# Altium footprint library 20210518.PcbLib: 414 footprints (part 5 of 26)
Each footprint in its own frame and in the unit in brackets; x right, y up, seen from the top. Pads: shape width x height; smd on the part's side, far side on the other; paste and mask are expansions set on the pad; w line width, h text height; cw(c..) or ccw(c..) is an arc to the next point about the centre after c.
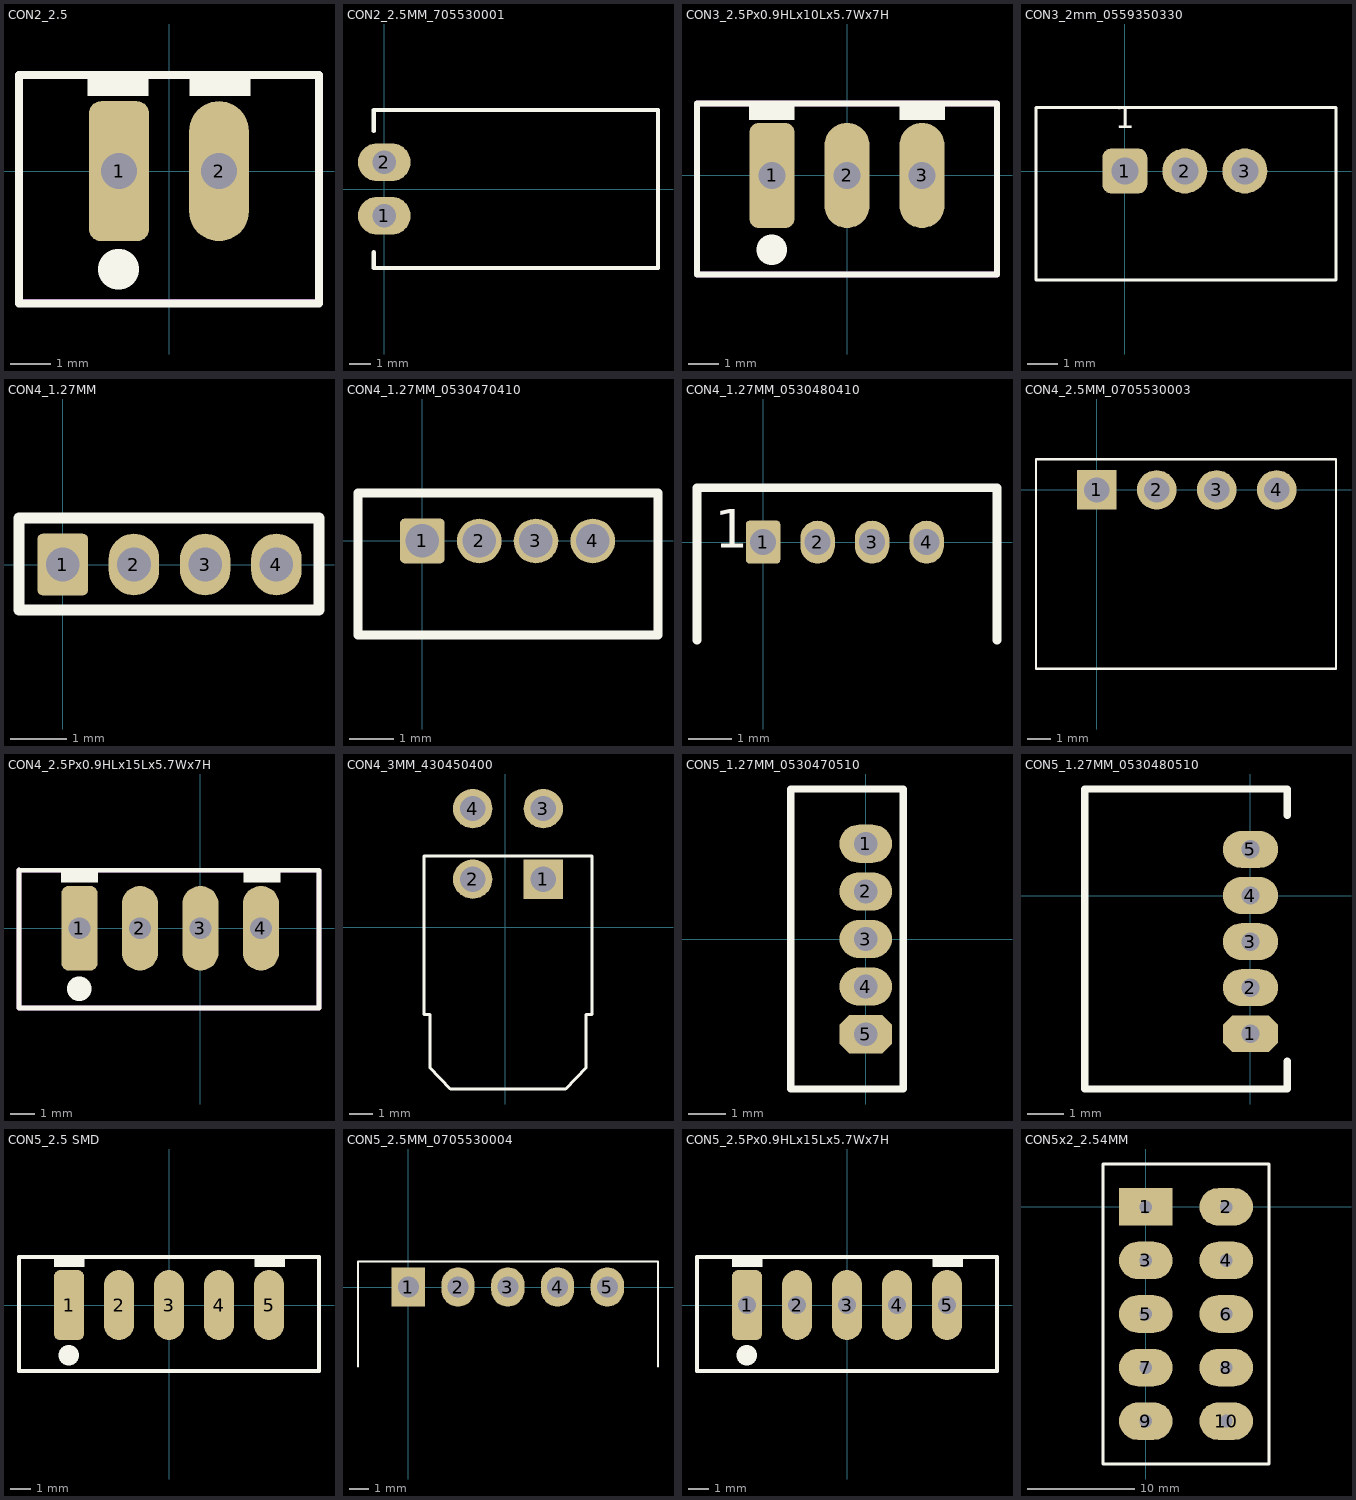
[diagram p4: the footprints below, top view; thin cyan lines are the x and y axes]

## CON2_2.5 [mm] "Connector; 2 Position, 2.5mm pin space, 0.9mm hole, Body 7.5x5.7mm, Height 7mm"
height 7
pads (2):
  rrect40% 1.5x3.5 hole 0.9: 1(-1.25,0)
  oval 1.5x3.5 hole 0.9: 2(1.25,0)
Top Overlay:
  circle w1: c-1.26,-2.45 r0.01
  rectangle: 0.508,1.875 2.032,2.413
  rectangle: -2.032,1.875 -0.508,2.413
  lines w0.2: -3.75,-3.302 3.75,-3.302 ; -3.75,-3.3 -3.75,2.4 3.75,2.4 3.75,-3.3
Mechanical 13:
  lines w0.2: -3.75,-3.3 3.75,-3.3 3.75,2.4 -3.75,2.4 -3.75,-3.3
Mechanical 15:
  lines w0.2: -3.75,-3.3 3.75,-3.3 3.75,2.4 -3.75,2.4 -3.75,-3.3
3D body: height 7, standoff -3.9, extent -3.65,-3.245 3.65,2.355

## CON2_2.5MM_705530001 [mm]
pads (2):
  oval 2.5x1.8 hole 1.1 mask+0.076: 1(0,-1.27) 2(0,1.27)
Top Overlay:
  lines w0.2: -0.5,-3 -0.5,-3.75 13,-3.75 13,3.75 -0.5,3.75 -0.5,2.75
3D body: height 7.06, standoff -3.22, extent -0.624,-3.683 12.965,3.683

## CON3_2.5Px0.9HLx10Lx5.7Wx7H [mm] "Connector; 3 Position, 2.5mm pin space, 0.9mm hole, Body 10x5.7mm, Height 7mm"
height 7
pads (3):
  rrect40% 1.5x3.5 hole 0.9: 1(-2.5,0)
  oval 1.5x3.5 hole 0.9: 2(0,0) 3(2.5,0)
Top Overlay:
  circle w1: c-2.51,-2.475 r0.01
  rectangle: 1.751,1.85 3.275,2.389
  rectangle: -3.275,1.85 -1.751,2.375
  lines w0.2: -5,-3.302 -5,2.4 5,2.4 5,-3.302 -5,-3.302
Mechanical 13:
  lines w0.2: -5,-3.3 5,-3.3 5,2.4 -5,2.4 -5,-3.3
Mechanical 15:
  lines w0.2: -5,-3.3 5,-3.3 5,2.4 -5,2.4 -5,-3.3
3D body: height 7, standoff -3.9, extent -4.95,-3.245 4.95,2.355

## CON3_2mm_0559350330 [mm] "Connector Header Through Hole, Right Angle 3 position 0.079\" (2.00mm)"
height 8.5
pads (3):
  rrect40% 1.5x1.5 hole 0.9: 1(0,0)
  round 1.5 hole 0.9: 2(2,0) 3(4,0)
Top Overlay:
  lines w0.1: -2.96,-3.64 -2.96,2.125 7.04,2.125 7.04,-3.64 -2.96,-3.64
  text "1" at -0.31,1.17 h1.27
3D body: height 6.8, standoff -3.1, extent -2.96,-9.625 7.04,2.125

## CON4_1.27MM [mm] "Connector; Header; 4 Position; 1.27mm pitch"
pads (4):
  rrect20% 0.9x1.1 hole 0.6: 1(0,0)
  oval 0.9x1.1 hole 0.6: 2(1.27,0) 3(2.54,0) 4(3.81,0)
Top Overlay:
  lines w0.2: -0.78,-0.81 -0.78,0.83 4.57,0.83 4.57,-0.81 -0.78,-0.81

## CON4_1.27MM_0530470410 [mm] "Connector; Header; 4 Position; 1.27mm pitch"
pads (4):
  rrect20% 1x1 hole 0.75: 1(0,0)
  round 1 hole 0.75: 2(1.27,0) 3(2.54,0) 4(3.81,0)
Top Overlay:
  lines w0.2: -1.44,-2.1 5.27,-2.1 5.27,1.07 -1.44,1.07 -1.44,-2.1
3D body: height 4.23, standoff -2.27, extent -1.475,-2.11 5.275,1.09

## CON4_1.27MM_0530480410 [mm] "Connector; Header; 4 Position; 1.27mm pitch - 0530480410"
pads (4):
  rrect20% 0.8x1 hole 0.6: 1(0,0)
  oval 0.8x1 hole 0.6: 2(1.27,0) 3(2.54,0) 4(3.81,0)
Top Overlay:
  lines w0.2: -1.54,-2.29 -1.54,1.27 5.45,1.27 5.45,-2.29
  text "1" at -1.13,-0.42 h1.52
3D body: height 3.6, standoff -2.2, extent -1.405,-4.465 5.345,1.035

## CON4_2.5MM_0705530003 [mm] "Connector Header Through Hole, Right Angle 4 position 0.100\" (2.54mm)"
pads (4):
  rect 1.67x1.67 hole 1.07: 1(0,0)
  round 1.67 hole 1.07: 2(2.54,0) 3(5.08,0) 4(7.62,0)
Top Overlay:
  lines w0.1: -2.57,-7.57 -2.57,1.3 10.13,1.3 10.13,-7.57 -2.57,-7.57
3D body: height 7.06, standoff -3.22, extent -2.57,-12.965 10.13,0.624

## CON4_2.5Px0.9HLx15Lx5.7Wx7H [mm] "Connector; 4 Position, 2.5mm pin space, 0.9mm hole, Body 15x5.7mm, Height 7mm"
height 7
pads (4):
  rrect40% 1.5x3.5 hole 0.9: 1(-5,0)
  oval 1.5x3.5 hole 0.9: 2(-2.5,0) 3(0,0) 4(2.5,0)
Top Overlay:
  circle w1: c-5.01,-2.5 r0.01
  rectangle: 1.776,1.9 3.3,2.413
  rectangle: -5.755,1.9 -4.231,2.413
  lines w0.2: -7.5,-3.302 -7.5,2.413 ; -7.5,-3.3 4.9,-3.3 4.9,2.4 -7.5,2.4
Mechanical 13:
  lines w0.2: -7.5,-3.302 -7.5,2.413 ; -7.5,-3.3 4.9,-3.3 4.9,2.4 -7.5,2.4
Mechanical 15:
  lines w0.2: -7.5,-3.302 -7.5,2.413 ; -7.5,-3.3 4.9,-3.3 4.9,2.4 -7.5,2.4

## CON4_3MM_430450400 [mm] "Connector Header Through Hole, Right Angle 4 position 0.118\" (3.00mm)"
pads (4):
  rect 1.67x1.67 hole 1.07: 1(1.627,2.034)
  round 1.67 hole 1.07: 2(-1.373,2.034) 3(1.627,5.034) 4(-1.373,5.034)
Top Overlay:
  lines w0.127: -3.448,-3.716 -3.448,3.024 3.702,3.024 3.702,-3.716 3.452,-3.716 3.452,-5.966 2.577,-6.886 -2.323,-6.886 -3.198,-5.966 -3.198,-3.716 -3.448,-3.716
3D body: height 8.83, standoff -3.12, extent -4.95,-6.92 5.2,5.32

## CON5_1.27MM_0530470510 [mil]
pads (5):
  oval 55x40 hole 25: 1(0,100) 2(0,50) 3(0,0) 4(0,-50)
  oct 55x40 hole 25: 5(0,-100)
Top Overlay:
  lines w7.87: -78.74,-157.48 39.37,-157.48 39.37,157.48 -78.74,157.48 -78.74,-157.48
3D body: height 168.31, standoff -87.6, extent -81.69,-157.47 44.29,157.49

## CON5_1.27MM_0530480510 [mm]
pads (5):
  oct 1.5x1 hole 0.5: 1(0,-3.75)
  oval 1.5x1 hole 0.5: 2(0,-2.5) 3(0,-1.25) 4(0,0) 5(0,1.25)
Top Overlay:
  lines w0.2: 1,-4.5 1,-5.25 -4.5,-5.25 -4.5,2.89 1,2.89 1,2.17
3D body: height 3.6, standoff -2.2, extent -4.5,-5.22 1,2.78

## CON5_2.5 SMD [mm] "Connector; 5 Position, 2.5mm pin space,  SMD solder pad"
height 7
pads (5):
  rrect40% 1.5x3.5 smd: 1(-5,0)
  oval 1.5x3.5 smd: 2(-2.5,0) 3(0,0) 4(2.5,0) 5(5,0)
Top Overlay:
  circle w1: c-5.01,-2.5 r0.01
  rectangle: -5.755,1.9 -4.231,2.413
  rectangle: 4.276,1.9 5.8,2.413
  lines w0.2: -7.5,-3.302 -7.5,2.413 ; -7.5,-3.3 7.5,-3.3 7.5,2.4 -7.5,2.4
Mechanical 13:
  lines w0.2: -7.5,-3.302 -7.5,2.413 ; -7.5,-3.3 7.5,-3.3 7.5,2.4 -7.5,2.4
Mechanical 15:
  lines w0.2: -7.5,-3.302 -7.5,2.413 ; -7.5,-3.3 7.5,-3.3 7.5,2.4 -7.5,2.4
3D body: height 7, standoff -3.9, extent -7.467,-3.245 7.433,2.355

## CON5_2.5MM_0705530004 [mm] "Connector Header Through Hole, Right Angle 5 position 0.100\" (2.54mm)"
pads (5):
  rect 1.7x2 hole 1.07: 1(0,0)
  oval 1.7x2 hole 1.07: 2(2.54,0) 3(5.08,0) 4(7.62,0) 5(10.16,0)
Top Overlay:
  lines w0.1: -2.57,-4.05 -2.57,1.3 12.75,1.3 12.75,-4.05
3D body: height 7.06, standoff -3.22, extent -2.48,-12.985 12.76,0.604

## CON5_2.5Px0.9HLx15Lx5.7Wx7H [mm] "Connector; 5 Position, 2.5mm pin space, 0.9mm hole, Body 15x5.7mm, Height 7mm"
height 7
pads (5):
  rrect40% 1.5x3.5 hole 0.9: 1(-5,0)
  oval 1.5x3.5 hole 0.9: 2(-2.5,0) 3(0,0) 4(2.5,0) 5(5,0)
Top Overlay:
  circle w1: c-5.01,-2.5 r0.01
  rectangle: 4.276,1.9 5.8,2.413
  rectangle: -5.755,1.9 -4.231,2.413
  lines w0.2: -7.5,-3.302 -7.5,2.413 ; -7.5,-3.3 7.5,-3.3 7.5,2.4 -7.5,2.4
Mechanical 13:
  lines w0.2: -7.5,-3.302 -7.5,2.413 ; -7.5,-3.3 7.5,-3.3 7.5,2.4 -7.5,2.4
Mechanical 15:
  lines w0.2: -7.5,-3.302 -7.5,2.413 ; -7.5,-3.3 7.5,-3.3 7.5,2.4 -7.5,2.4
3D body: height 7, standoff -3.9, extent -7.467,-3.245 7.433,2.355

## CON5x2_2.54MM [mm] "5mm aralýklý"
height 15
pads (10):
  rect 5x3.5 hole 1.2: 1(0,0)
  oval 5x3.5 hole 1.2: 2(7.5,0) 3(0,-5) 4(7.5,-5) 5(0,-10) 6(7.5,-10) 7(0,-15) 8(7.5,-15) 9(0,-20) 10(7.5,-20)
Top Overlay:
  lines w0.254: -4,-24 11.5,-24 11.5,4 -4,4 -4,-24